# Altium footprint library Molex FFC - FPC Connectors (Through-Hole).PcbLib: 219 footprints (part 2 of 14)
Each footprint in its own frame and in the unit in brackets; x right, y up, seen from the top. Pads: shape width x height; smd on the part's side, far side on the other; paste and mask are expansions set on the pad; w line width, h text height; cw(c..) or ccw(c..) is an arc to the next point about the centre after c.
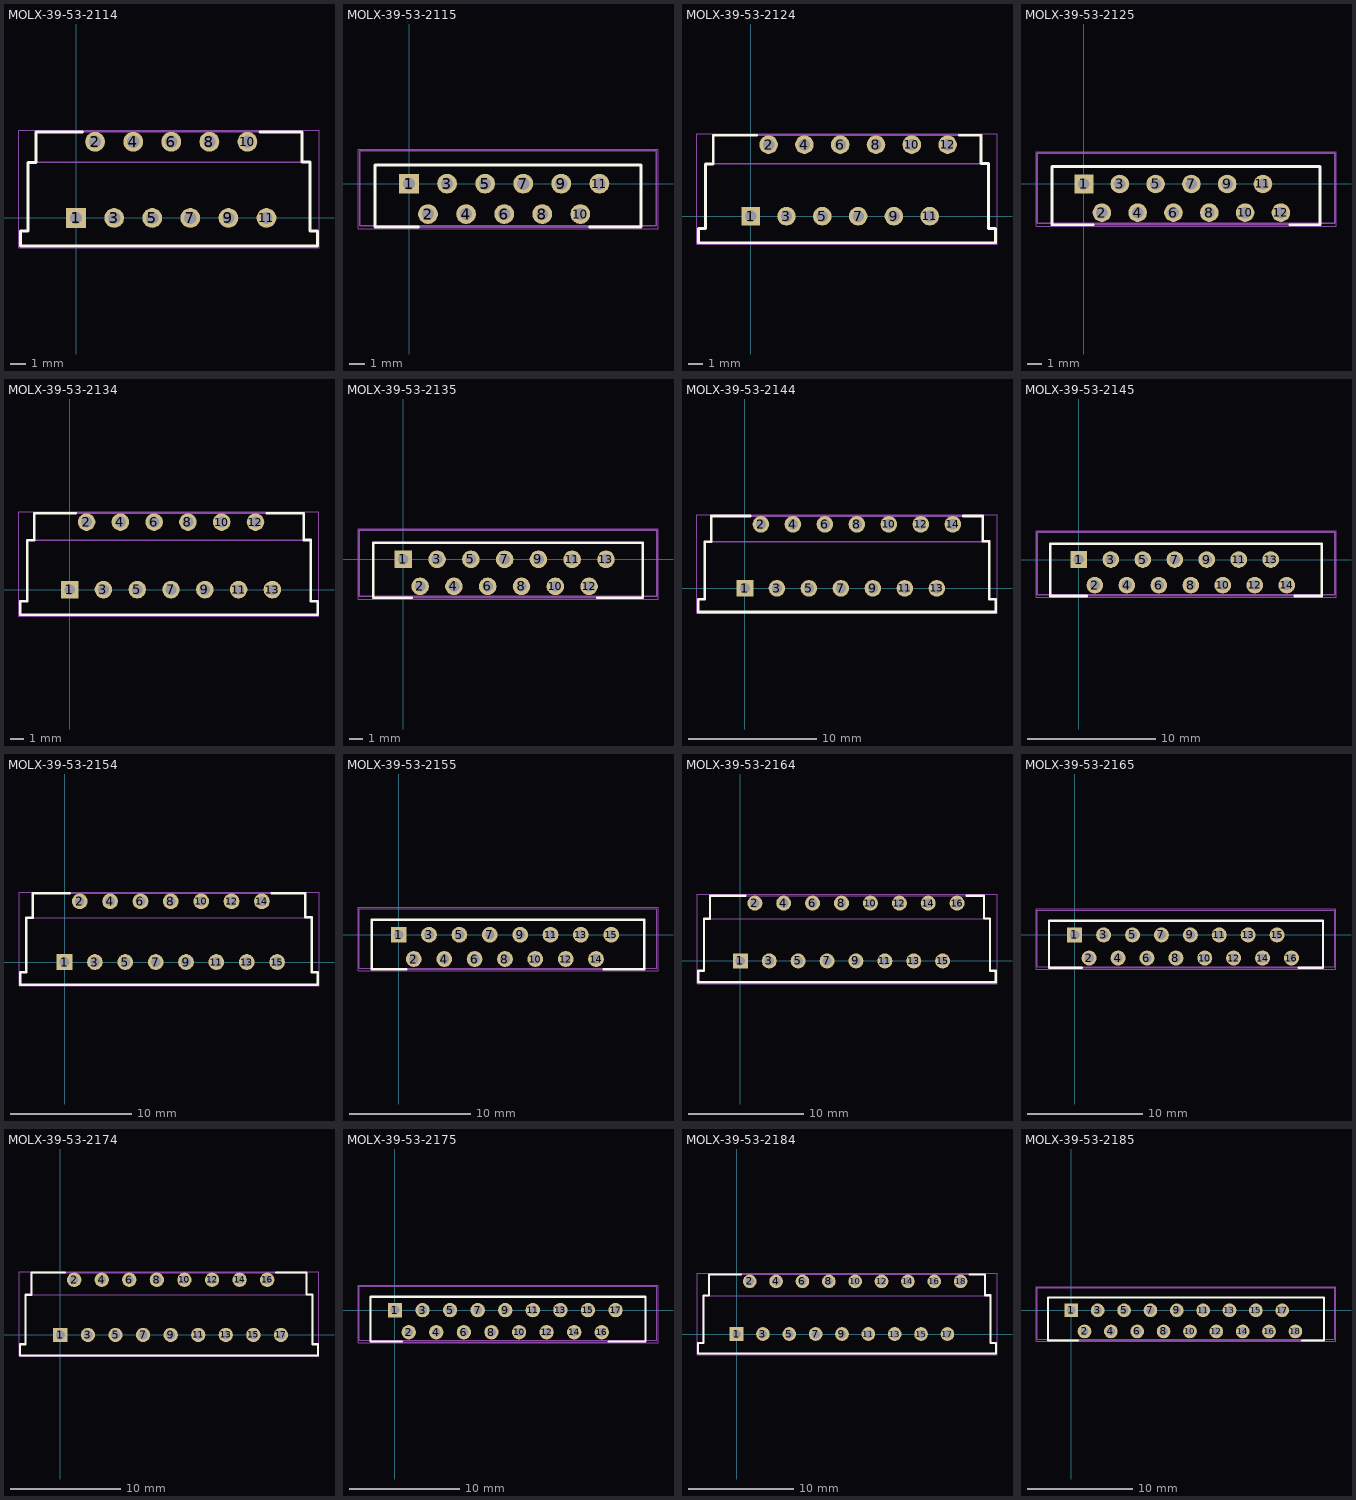
[diagram p1: the footprints below, top view; thin cyan lines are the x and y axes]

## MOLX-39-53-2114 [mm] "FPC Connector, 11-Leads, Right Angle, Pitch 1.25 mm, Mated Height 5.0 mm, Through Hole"
height 5.412
pads (11):
  rect 1.3x1.3 hole 0.8: 1(0,0)
  round 1.3 hole 0.8: 2(1.25,5) 3(2.5,0) 4(3.75,5) 5(5,0) 6(6.25,5) 7(7.5,0) 8(8.75,5) 9(10,0) 10(11.25,5) 11(12.5,0)
Top Overlay:
  lines w0.2: -2.63,3.65 -3.15,3.65 -3.15,-0.85 -3.65,-0.85 -3.65,-1.85 15.85,-1.85 15.85,-0.85 15.35,-0.85 15.35,3.65 ; -2.62,3.66 -2.62,5.65 0.425,5.65 ; 12.075,5.65 14.83,5.65 14.83,3.68 15.35,3.68
Mechanical 13:
  lines w0.1: -2.62,3.66 -2.62,5.65 14.82,5.65 14.82,3.68 ; -3.65,-1.85 15.85,-1.85 15.85,-0.85 15.35,-0.85 15.35,3.65 -3.15,3.65 -3.15,-0.85 -3.65,-0.85 -3.65,-1.85
Mechanical 15:
  lines w0.05: -3.75,-1.95 -3.75,5.75 15.95,5.75 15.95,-1.95 -3.75,-1.95
3D body "039532114.stp": height 5.41, standoff -3.49, extent -3.65,-1.85 15.85,5.65

## MOLX-39-53-2115 [mm] "FPC Connector, 11-Leads, Vertical, Pitch 1.25 mm, Mated Height 7.5 mm, Through Hole"
height 7.512
pads (11):
  rect 1.3x1.3 hole 0.8: 1(0,0)
  round 1.3 hole 0.8: 2(1.25,-2) 3(2.5,0) 4(3.75,-2) 5(5,0) 6(6.25,-2) 7(7.5,0) 9(10,0) 10(11.25,-2) 11(12.5,0)
  round 1.3 hole 0.762: 8(8.75,-2)
Top Overlay:
  lines w0.2: 0.633,-2.85 -2.22,-2.85 -2.22,1.22 15.225,1.22 ; 11.867,-2.85 15.225,-2.85 ; 15.22,-2.85 15.22,1.22
Mechanical 13:
  lines w0.1: -3.25,-2.75 16.25,-2.75 16.25,2.15 -3.25,2.15 -3.25,-2.75 ; -2.22,-2.85 -2.22,1.22 15.22,1.22 15.22,-2.85 -2.22,-2.85
Mechanical 15:
  lines w0.05: -3.35,-2.95 16.35,-2.95 16.35,2.25 -3.35,2.25 -3.35,-2.95
3D body "039532115.stp": height 7.51, standoff -3.49, extent -3.25,-2.85 16.25,2.15

## MOLX-39-53-2124 [mm] "FPC Connector, 12-Leads, Right Angle, Pitch 1.25 mm, Mated Height 5.0 mm, Through Hole"
height 5.412
pads (12):
  rect 1.3x1.3 hole 0.8: 1(0,0)
  round 1.3 hole 0.8: 2(1.25,5) 3(2.5,0) 4(3.75,5) 5(5,0) 6(6.25,5) 7(7.5,0) 8(8.75,5) 9(10,0) 10(11.25,5) 11(12.5,0) 12(13.75,5)
Top Overlay:
  lines w0.2: -2.63,3.65 -3.15,3.65 -3.15,-0.85 -3.65,-0.85 -3.65,-1.85 17.1,-1.85 17.1,-0.85 16.6,-0.85 16.6,3.65 ; -2.62,3.66 -2.62,5.65 0.425,5.65 ; 14.575,5.65 16.08,5.65 16.08,3.68 16.6,3.68
Mechanical 13:
  lines w0.1: -2.62,3.66 -2.62,5.65 16.07,5.65 16.07,3.68 ; -3.65,-1.85 17.1,-1.85 17.1,-0.85 16.6,-0.85 16.6,3.65 -3.15,3.65 -3.15,-0.85 -3.65,-0.85 -3.65,-1.85
Mechanical 15:
  lines w0.05: -3.75,-1.95 -3.75,5.75 17.2,5.75 17.2,-1.95 -3.75,-1.95
3D body "039532124.stp": height 5.41, standoff -3.49, extent -3.65,-1.85 17.1,5.65

## MOLX-39-53-2125 [mm] "FPC Connector, 12-Leads, Vertical, Pitch 1.25 mm, Mated Height 7.5 mm, Through Hole"
height 7.512
pads (12):
  rect 1.3x1.3 hole 0.8: 1(0,0)
  round 1.3 hole 0.8: 2(1.25,-2) 3(2.5,0) 4(3.75,-2) 5(5,0) 6(6.25,-2) 7(7.5,0) 9(10,0) 10(11.25,-2) 11(12.5,0) 12(13.75,-2)
  round 1.3 hole 0.762: 8(8.75,-2)
Top Overlay:
  lines w0.2: 0.633,-2.85 -2.22,-2.85 -2.22,1.22 16.47,1.22 16.47,-2.85 14.367,-2.85
Mechanical 13:
  lines w0.1: -3.25,-2.75 -3.25,2.15 17.5,2.15 17.5,-2.75 -3.25,-2.75 ; -2.22,-2.85 16.47,-2.85 16.47,1.22 -2.22,1.22 -2.22,-2.85
Mechanical 15:
  lines w0.05: -3.35,-2.95 -3.35,2.25 17.6,2.25 17.6,-2.95 -3.35,-2.95
3D body "039532125.stp": height 7.51, standoff -3.49, extent -3.25,-2.85 17.5,2.15

## MOLX-39-53-2134 [mm] "FPC Connector, 13-Leads, Right Angle, Pitch 1.25 mm, Mated Height 5.0 mm, Through Hole"
height 5.412
pads (13):
  rect 1.3x1.3 hole 0.8: 1(0,0)
  round 1.3 hole 0.8: 2(1.25,5) 3(2.5,0) 4(3.75,5) 5(5,0) 6(6.25,5) 7(7.5,0) 8(8.75,5) 9(10,0) 10(11.25,5) 11(12.5,0) 12(13.75,5) 13(15,0)
Top Overlay:
  lines w0.2: -2.63,3.65 -3.15,3.65 -3.15,-0.85 -3.65,-0.85 -3.65,-1.85 18.35,-1.85 18.35,-0.85 17.85,-0.85 17.85,3.65 ; -2.62,3.66 -2.62,5.65 0.425,5.65 ; 14.575,5.65 17.33,5.65 17.33,3.68 17.85,3.68
Mechanical 13:
  lines w0.1: -2.62,3.66 -2.62,5.65 17.32,5.65 17.32,3.68 ; -3.65,-1.85 18.35,-1.85 18.35,-0.85 17.85,-0.85 17.85,3.65 -3.15,3.65 -3.15,-0.85 -3.65,-0.85 -3.65,-1.85
Mechanical 15:
  lines w0.05: -3.75,-1.95 -3.75,5.75 18.45,5.75 18.45,-1.95 -3.75,-1.95
3D body "039532134.stp": height 5.41, standoff -3.49, extent -3.65,-1.85 18.35,5.65

## MOLX-39-53-2135 [mm] "FPC Connector, 13-Leads, Vertical, Pitch 1.25 mm, Mated Height 7.5 mm, Through Hole"
height 7.512
pads (13):
  rect 1.3x1.3 hole 0.8: 1(0,0)
  round 1.3 hole 0.8: 2(1.25,-2) 3(2.5,0) 4(3.75,-2) 5(5,0) 6(6.25,-2) 7(7.5,0) 9(10,0) 10(11.25,-2) 11(12.5,0) 12(13.75,-2) 13(15,0)
  round 1.3 hole 0.762: 8(8.75,-2)
Top Overlay:
  lines w0.2: 0.633,-2.85 -2.22,-2.85 -2.22,1.22 17.72,1.22 17.72,-2.85 14.367,-2.85
Mechanical 13:
  lines w0.1: -3.25,-2.75 18.75,-2.75 18.75,2.15 -3.25,2.15 -3.25,-2.75 ; -2.22,-2.85 -2.22,1.22 17.72,1.22 17.72,-2.85 -2.22,-2.85
Mechanical 15:
  lines w0.05: -3.35,-2.95 18.85,-2.95 18.85,2.25 -3.35,2.25 -3.35,-2.95
3D body "039532135.stp": height 7.51, standoff -3.49, extent -3.25,-2.85 18.75,2.15

## MOLX-39-53-2144 [mm] "FPC Connector, 14-Leads, Right Angle, Pitch 1.25 mm, Mated Height 5.0 mm, Through Hole"
height 5.412
pads (14):
  rect 1.3x1.3 hole 0.8: 1(0,0)
  round 1.3 hole 0.8: 2(1.25,5) 3(2.5,0) 4(3.75,5) 5(5,0) 6(6.25,5) 7(7.5,0) 8(8.75,5) 9(10,0) 10(11.25,5) 11(12.5,0) 12(13.75,5) 13(15,0) 14(16.25,5)
Top Overlay:
  lines w0.2: -2.63,3.65 -3.15,3.65 -3.15,-0.85 -3.65,-0.85 -3.65,-1.85 19.6,-1.85 19.6,-0.85 19.1,-0.85 19.1,3.65 ; -2.62,3.66 -2.62,5.65 0.425,5.65 ; 17.075,5.65 18.58,5.65 18.58,3.68 19.1,3.68
Mechanical 13:
  lines w0.1: -2.62,3.66 -2.62,5.65 18.57,5.65 18.57,3.68 ; -3.65,-1.85 19.6,-1.85 19.6,-0.85 19.1,-0.85 19.1,3.65 -3.15,3.65 -3.15,-0.85 -3.65,-0.85 -3.65,-1.85
Mechanical 15:
  lines w0.05: -3.75,-1.95 -3.75,5.75 19.7,5.75 19.7,-1.95 -3.75,-1.95
3D body "039532144.stp": height 5.41, standoff -3.49, extent -3.65,-1.85 19.6,5.65

## MOLX-39-53-2145 [mm] "FPC Connector, 14-Leads, Vertical, Pitch 1.25 mm, Mated Height 7.5 mm, Through Hole"
height 7.512
pads (14):
  rect 1.3x1.3 hole 0.8: 1(0,0)
  round 1.3 hole 0.8: 2(1.25,-2) 3(2.5,0) 4(3.75,-2) 5(5,0) 6(6.25,-2) 7(7.5,0) 9(10,0) 10(11.25,-2) 11(12.5,0) 12(13.75,-2) 13(15,0) 14(16.25,-2)
  round 1.3 hole 0.762: 8(8.75,-2)
Top Overlay:
  lines w0.2: 0.633,-2.85 -2.22,-2.85 -2.22,1.22 18.97,1.22 18.97,-2.85 16.867,-2.85
Mechanical 13:
  lines w0.1: -3.25,-2.75 20,-2.75 20,2.15 -3.25,2.15 -3.25,-2.75 ; -2.22,-2.85 -2.22,1.22 18.97,1.22 18.97,-2.85 -2.22,-2.85
Mechanical 15:
  lines w0.05: -3.35,-2.95 20.1,-2.95 20.1,2.25 -3.35,2.25 -3.35,-2.95
3D body "039532145.stp": height 7.51, standoff -3.49, extent -3.25,-2.85 20,2.15

## MOLX-39-53-2154 [mm] "FPC Connector, 15-Leads, Right Angle, Pitch 1.25 mm, Mated Height 5.0 mm, Through Hole"
height 5.412
pads (15):
  rect 1.3x1.3 hole 0.8: 1(0,0)
  round 1.3 hole 0.8: 2(1.25,5) 3(2.5,0) 4(3.75,5) 5(5,0) 6(6.25,5) 7(7.5,0) 8(8.75,5) 9(10,0) 10(11.25,5) 11(12.5,0) 12(13.75,5) 13(15,0) 14(16.25,5) 15(17.5,0)
Top Overlay:
  lines w0.2: -2.63,3.65 -3.15,3.65 -3.15,-0.85 -3.65,-0.85 -3.65,-1.85 20.85,-1.85 20.85,-0.85 20.35,-0.85 20.35,3.65 ; -2.62,3.66 -2.62,5.65 0.425,5.65 ; 17.075,5.65 19.83,5.65 19.83,3.68 20.35,3.68
Mechanical 13:
  lines w0.1: -2.62,3.66 -2.62,5.65 19.82,5.65 19.82,3.68 ; -3.65,-1.85 20.85,-1.85 20.85,-0.85 20.35,-0.85 20.35,3.65 -3.15,3.65 -3.15,-0.85 -3.65,-0.85 -3.65,-1.85
Mechanical 15:
  lines w0.05: -3.75,-1.95 -3.75,5.75 20.95,5.75 20.95,-1.95 -3.75,-1.95
3D body "039532154.stp": height 5.41, standoff -3.49, extent -3.65,-1.85 20.85,5.65

## MOLX-39-53-2155 [mm] "FPC Connector, 15-Leads, Vertical, Pitch 1.25 mm, Mated Height 7.5 mm, Through Hole"
height 7.512
pads (15):
  rect 1.3x1.3 hole 0.8: 1(0,0)
  round 1.3 hole 0.8: 2(1.25,-2) 3(2.5,0) 4(3.75,-2) 5(5,0) 6(6.25,-2) 7(7.5,0) 8(8.75,-2) 9(10,0) 10(11.25,-2) 11(12.5,0) 12(13.75,-2) 13(15,0) 14(16.25,-2) 15(17.5,0)
Top Overlay:
  lines w0.2: 0.633,-2.85 -2.22,-2.85 -2.22,1.22 20.22,1.22 20.22,-2.85 16.867,-2.85
Mechanical 13:
  lines w0.1: -3.25,-2.75 -3.25,2.15 21.25,2.15 21.25,-2.75 -3.25,-2.75 ; -2.22,-2.85 20.22,-2.85 20.22,1.22 -2.22,1.22 -2.22,-2.85
Mechanical 15:
  lines w0.05: -3.35,-2.95 21.35,-2.95 21.35,2.25 -3.35,2.25 -3.35,-2.95
3D body "039532155.stp": height 7.51, standoff -3.49, extent -3.25,-2.85 21.25,2.15

## MOLX-39-53-2164 [mm] "FPC Connector, 16-Leads, Right Angle, Pitch 1.25 mm, Mated Height 5.0 mm, Through Hole"
height 5.412
pads (16):
  rect 1.3x1.3 hole 0.8: 1(0,0)
  round 1.3 hole 0.8: 2(1.25,5) 3(2.5,0) 4(3.75,5) 5(5,0) 6(6.25,5) 7(7.5,0) 8(8.75,5) 9(10,0) 10(11.25,5) 11(12.5,0) 12(13.75,5) 13(15,0) 14(16.25,5) 15(17.5,0) 16(18.75,5)
Top Overlay:
  lines w0.2: -2.63,3.65 -3.15,3.65 -3.15,-0.85 -3.65,-0.85 -3.65,-1.85 22.1,-1.85 22.1,-0.85 21.6,-0.85 21.6,3.65 ; -2.62,3.66 -2.62,5.65 0.425,5.65 ; 19.575,5.65 21.07,5.65 21.07,3.68 21.6,3.68
Mechanical 13:
  lines w0.1: -2.62,3.66 -2.62,5.65 21.07,5.65 21.07,3.68 ; -3.65,-1.85 22.1,-1.85 22.1,-0.85 21.6,-0.85 21.6,3.65 -3.15,3.65 -3.15,-0.85 -3.65,-0.85 -3.65,-1.85
Mechanical 15:
  lines w0.05: -3.75,-1.95 -3.75,5.75 22.2,5.75 22.2,-1.95 -3.75,-1.95
3D body "039532164.stp": height 5.41, standoff -3.49, extent -3.65,-1.85 22.1,5.65

## MOLX-39-53-2165 [mm] "FPC Connector, 16-Leads, Vertical, Pitch 1.25 mm, Mated Height 7.5 mm, Through Hole"
height 7.512
pads (16):
  rect 1.3x1.3 hole 0.8: 1(0,0)
  round 1.3 hole 0.8: 2(1.25,-2) 3(2.5,0) 4(3.75,-2) 5(5,0) 6(6.25,-2) 7(7.5,0) 8(8.75,-2) 9(10,0) 10(11.25,-2) 11(12.5,0) 12(13.75,-2) 13(15,0) 14(16.25,-2) 15(17.5,0) 16(18.75,-2)
Top Overlay:
  lines w0.2: 0.633,-2.85 -2.22,-2.85 -2.22,1.22 21.47,1.22 21.47,-2.85 19.367,-2.85
Mechanical 13:
  lines w0.1: -3.25,-2.75 22.5,-2.75 22.5,2.15 -3.25,2.15 -3.25,-2.75 ; -2.22,-2.85 -2.22,1.22 21.47,1.22 21.47,-2.85 -2.22,-2.85
Mechanical 15:
  lines w0.05: -3.35,-2.95 -3.35,2.25 22.6,2.25 22.6,-2.95 -3.35,-2.95
3D body "039532165.stp": height 7.51, standoff -3.49, extent -3.25,-2.85 22.5,2.15

## MOLX-39-53-2174 [mm] "FPC Connector, 17-Leads, Right Angle, Pitch 1.25 mm, Mated Height 5.0 mm, Through Hole"
height 5.412
pads (17):
  rect 1.3x1.3 hole 0.8: 1(0,0)
  round 1.3 hole 0.8: 2(1.25,5) 3(2.5,0) 4(3.75,5) 5(5,0) 6(6.25,5) 7(7.5,0) 8(8.75,5) 9(10,0) 10(11.25,5) 11(12.5,0) 12(13.75,5) 13(15,0) 14(16.25,5) 15(17.5,0) 16(18.75,5) 17(20,0)
Top Overlay:
  lines w0.2: -2.62,3.65 -3.15,3.65 -3.15,-0.85 -3.65,-0.85 -3.65,-1.85 23.35,-1.85 23.35,-0.85 22.85,-0.85 22.85,3.65 ; -2.62,3.66 -2.62,5.65 0.425,5.65 ; 19.575,5.65 22.32,5.65 22.32,3.68 22.85,3.68
Mechanical 13:
  lines w0.1: -2.62,3.66 -2.62,5.65 22.32,5.65 22.32,3.68 ; -3.65,-1.85 23.35,-1.85 23.35,-0.85 22.85,-0.85 22.85,3.65 -3.15,3.65 -3.15,-0.85 -3.65,-0.85 -3.65,-1.85
Mechanical 15:
  lines w0.05: -3.75,-1.95 -3.75,5.75 23.45,5.75 23.45,-1.95 -3.75,-1.95
3D body "039532174.stp": height 5.41, standoff -3.49, extent -3.65,-1.85 23.35,5.65

## MOLX-39-53-2175 [mm] "FPC Connector, 17-Leads, Vertical, Pitch 1.25 mm, Mated Height 7.5 mm, Through Hole"
height 7.512
pads (17):
  rect 1.3x1.3 hole 0.8: 1(0,0)
  round 1.3 hole 0.8: 2(1.25,-2) 3(2.5,0) 4(3.75,-2) 5(5,0) 6(6.25,-2) 7(7.5,0) 8(8.75,-2) 9(10,0) 10(11.25,-2) 11(12.5,0) 12(13.75,-2) 13(15,0) 14(16.25,-2) 15(17.5,0) 16(18.75,-2) 17(20,0)
Top Overlay:
  lines w0.2: 0.633,-2.85 -2.22,-2.85 -2.22,1.22 22.72,1.22 22.72,-2.85 19.367,-2.85
Mechanical 13:
  lines w0.1: -3.25,-2.75 -3.25,2.15 23.75,2.15 23.75,-2.75 -3.25,-2.75 ; -2.22,-2.85 22.72,-2.85 22.72,1.22 -2.22,1.22 -2.22,-2.85
Mechanical 15:
  lines w0.05: -3.35,-2.95 23.85,-2.95 23.85,2.25 -3.35,2.25 -3.35,-2.95
3D body "039532175.stp": height 7.51, standoff -3.49, extent -3.25,-2.85 23.75,2.15

## MOLX-39-53-2184 [mm] "FPC Connector, 18-Leads, Right Angle, Pitch 1.25 mm, Mated Height 5.0 mm, Through Hole"
height 5.412
pads (18):
  rect 1.3x1.3 hole 0.8: 1(0,0)
  round 1.3 hole 0.8: 2(1.25,5) 3(2.5,0) 4(3.75,5) 5(5,0) 6(6.25,5) 7(7.5,0) 8(8.75,5) 9(10,0) 10(11.25,5) 11(12.5,0) 12(13.75,5) 13(15,0) 14(16.25,5) 15(17.5,0) 16(18.75,5) 17(20,0) 18(21.25,5)
Top Overlay:
  lines w0.2: -2.62,3.65 -3.15,3.65 -3.15,-0.85 -3.65,-0.85 -3.65,-1.85 24.6,-1.85 24.6,-0.85 24.1,-0.85 24.1,3.65 ; -2.62,3.66 -2.62,5.65 0.425,5.65 ; 22.075,5.65 23.57,5.65 23.57,3.68 24.1,3.68
Mechanical 13:
  lines w0.1: -2.62,3.66 -2.62,5.65 23.57,5.65 23.57,3.68 ; -3.65,-1.85 -3.65,-0.85 -3.15,-0.85 -3.15,3.65 24.1,3.65 24.1,-0.85 24.6,-0.85 24.6,-1.85 -3.65,-1.85
Mechanical 15:
  lines w0.05: -3.75,-1.95 24.7,-1.95 24.7,5.75 -3.75,5.75 -3.75,-1.95
3D body "039532184.stp": height 5.41, standoff -3.49, extent -3.65,-1.85 24.6,5.65

## MOLX-39-53-2185 [mm] "FPC Connector, 18-Leads, Vertical, Pitch 1.25 mm, Mated Height 7.5 mm, Through Hole"
height 7.512
pads (18):
  rect 1.3x1.3 hole 0.8: 1(0,0)
  round 1.3 hole 0.8: 2(1.25,-2) 3(2.5,0) 4(3.75,-2) 5(5,0) 6(6.25,-2) 7(7.5,0) 8(8.75,-2) 9(10,0) 10(11.25,-2) 11(12.5,0) 12(13.75,-2) 13(15,0) 14(16.25,-2) 15(17.5,0) 16(18.75,-2) 17(20,0) 18(21.25,-2)
Top Overlay:
  lines w0.2: 0.633,-2.85 -2.22,-2.85 -2.22,1.22 23.97,1.22 23.97,-2.85 21.867,-2.85
Mechanical 13:
  lines w0.1: -3.25,-2.75 25,-2.75 25,2.15 -3.25,2.15 -3.25,-2.75 ; -2.22,-2.85 -2.22,1.22 23.97,1.22 23.97,-2.85 -2.22,-2.85
Mechanical 15:
  lines w0.05: -3.35,-2.95 -3.35,2.25 25.1,2.25 25.1,-2.95 -3.35,-2.95
3D body "039532185.stp": height 7.51, standoff -3.49, extent -3.25,-2.85 25,2.15